# Altium footprint library 3.22-杂项.PcbLib: 985 footprints (part 42 of 64)
Each footprint in its own frame and in the unit in brackets; x right, y up, seen from the top. Pads: shape width x height; smd on the part's side, far side on the other; paste and mask are expansions set on the pad; w line width, h text height; cw(c..) or ccw(c..) is an arc to the next point about the centre after c.
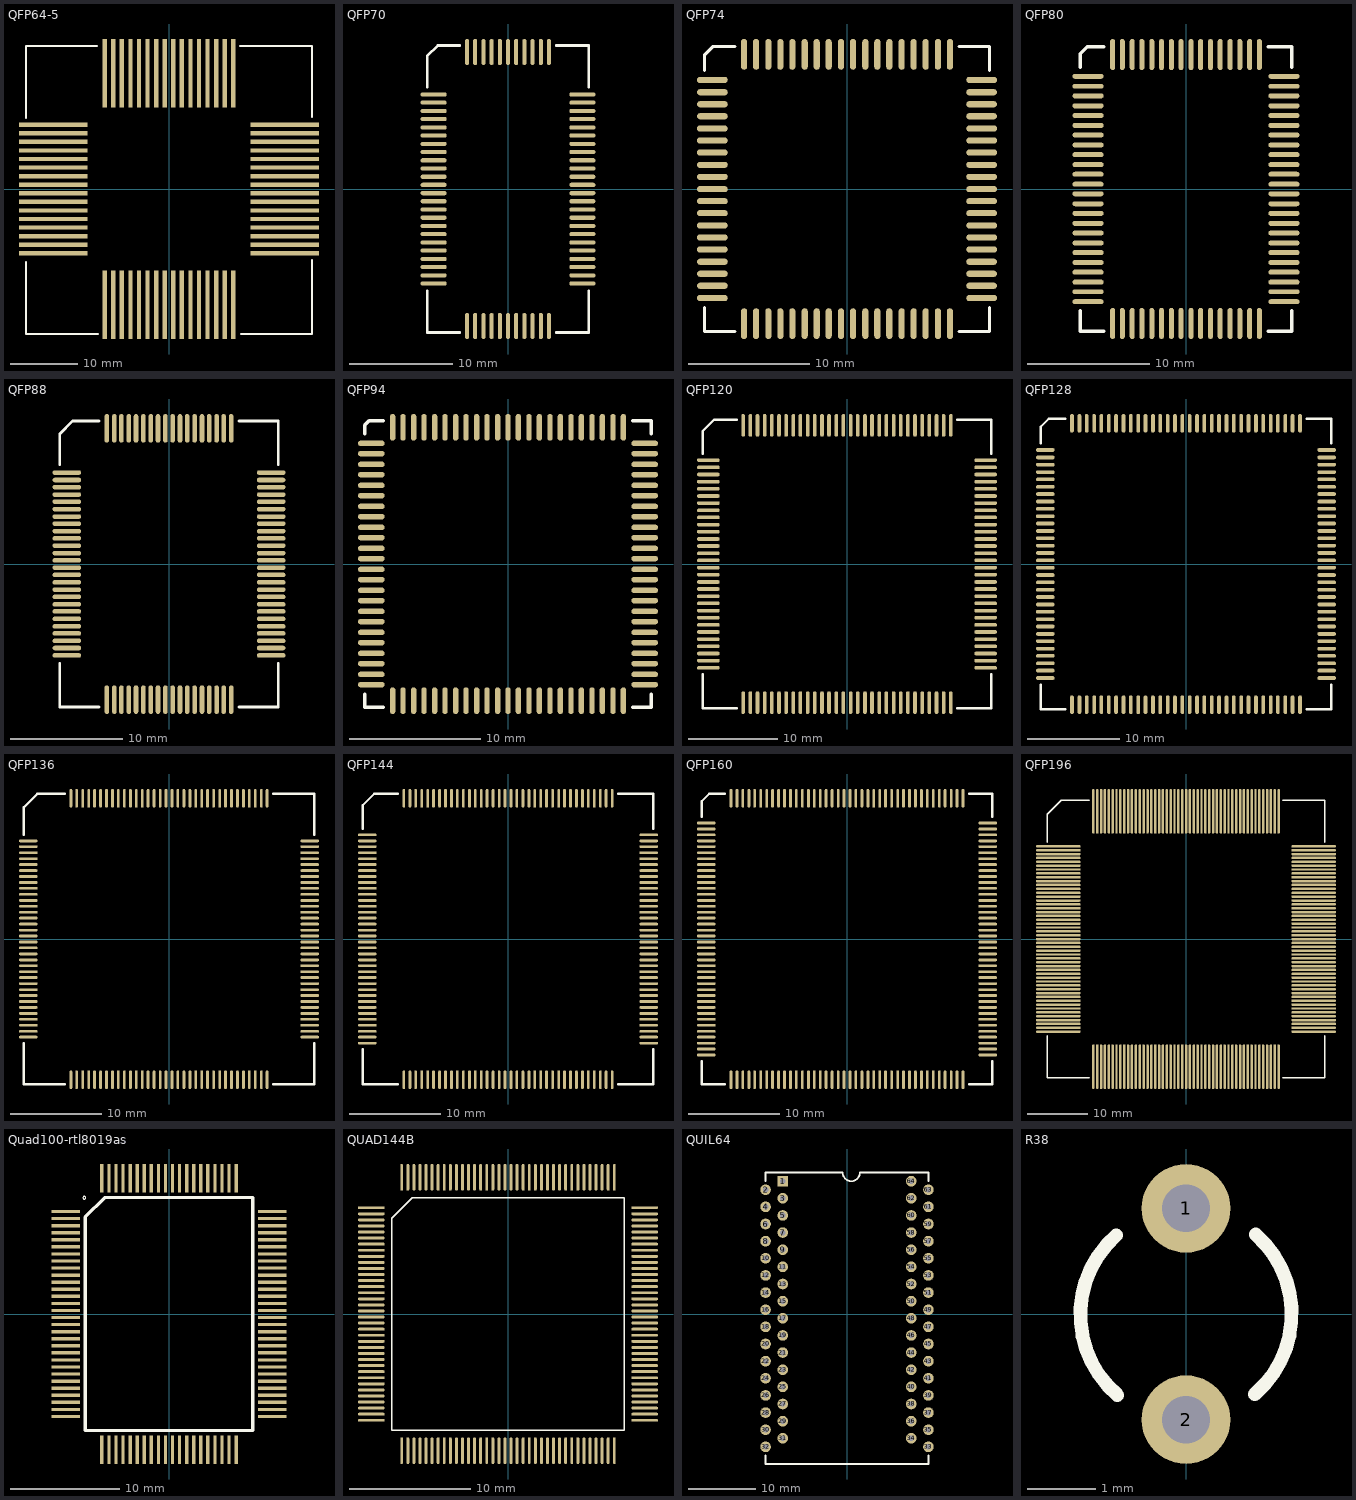
[diagram p41: the footprints below, top view; thin cyan lines are the x and y axes]

## QFP64-5 [mil]
pads (64):
  rect 400x25 smd: 1(-675,375) 2(-675,325) 3(-675,275) 4(-675,225) 5(-675,175) 6(-675,125) 7(-675,75) 8(-675,25) 9(-675,-25) 10(-675,-75) 11(-675,-125) 12(-675,-175) 13(-675,-225) 14(-675,-275) 15(-675,-325) 16(-675,-375) 33(675,-375) 34(675,-325) 35(675,-275) 36(675,-225) 37(675,-175) 38(675,-125) 39(675,-75) 40(675,-25) 41(675,25) 42(675,75) 43(675,125) 44(675,175) 45(675,225) 46(675,275) 47(675,325) 48(675,375)
  rect 25x400 smd: 17(-375,-675) 18(-325,-675) 19(-275,-675) 20(-225,-675) 21(-175,-675) 22(-125,-675) 23(-75,-675) 24(-25,-675) 25(25,-675) 26(75,-675) 27(125,-675) 28(175,-675) 29(225,-675) 30(275,-675) 31(325,-675) 32(375,-675) 49(375,675) 50(325,675) 51(275,675) 52(225,675) 53(175,675) 54(125,675) 55(75,675) 56(25,675) 57(-25,675) 58(-75,675) 59(-125,675) 60(-175,675) 61(-225,675) 62(-275,675) 63(-325,675) 64(-375,675)
Top Overlay:
  lines w12: -835,-425 -835,-845 -415,-845 ; -835,415 -835,835 -420,835 ; 415,835 835,835 835,420 ; 420,-845 835,-845 835,-415

## QFP70 [mil]
pads (70):
  oval 100x16 smd: 1(-285,362) 2(-285,331) 3(-285,299) 4(-285,268) 5(-285,236) 6(-285,205) 7(-285,173) 8(-285,142) 9(-285,110) 10(-285,79) 11(-285,47) 12(-285,16) 13(-285,-16) 14(-285,-47) 15(-285,-79) 16(-285,-110) 17(-285,-142) 18(-285,-173) 19(-285,-205) 20(-285,-236) 21(-285,-268) 22(-285,-299) 23(-285,-331) 24(-285,-362) 36(285,-362) 37(285,-331) 38(285,-299) 39(285,-268) 40(285,-236) 41(285,-205) 42(285,-173) 43(285,-142) 44(285,-110) 45(285,-79) 46(285,-47) 47(285,-16) 48(285,16) 49(285,47) 50(285,79) 51(285,110) 52(285,142) 53(285,173) 54(285,205) 55(285,236) 56(285,268) 57(285,299) 58(285,331) 59(285,362)
  oval 16x100 smd: 25(-157,-525) 26(-126,-525) 27(-94,-525) 28(-63,-525) 29(-31,-525) 30(0,-525) 31(31,-525) 32(63,-525) 33(94,-525) 34(126,-525) 35(157,-525) 60(157,525) 61(126,525) 62(94,525) 63(63,525) 64(31,525) 65(0,525) 66(-31,525) 67(-63,525) 68(-94,525) 69(-126,525) 70(-157,525)
Top Overlay:
  lines w10: -310,-390 -310,-550 -185,-550 ; -310,390 -310,509 -269,550 -185,550 ; 185,-550 310,-550 310,-390 ; 185,550 310,550 310,390

## QFP74 [mil]
pads (74):
  oval 100x20 smd: 1(-437.5,354.5) 2(-437.5,314.5) 3(-437.5,275.5) 4(-437.5,236.5) 5(-437.5,196.5) 6(-437.5,157.5) 7(-437.5,118.5) 8(-437.5,78.5) 9(-437.5,39.5) 10(-437.5,-0.5) 11(-437.5,-39.5) 12(-437.5,-78.5) 13(-437.5,-118.5) 14(-437.5,-157.5) 15(-437.5,-196.5) 16(-437.5,-236.5) 17(-437.5,-275.5) 18(-437.5,-314.5) 19(-437.5,-354.5) 38(437.5,-354.5) 39(437.5,-314.5) 40(437.5,-275.5) 41(437.5,-236.5) 42(437.5,-196.5) 43(437.5,-157.5) 44(437.5,-118.5) 45(437.5,-78.5) 46(437.5,-39.5) 47(437.5,-0.5) 48(437.5,39.5) 49(437.5,78.5) 50(437.5,118.5) 51(437.5,157.5) 52(437.5,196.5) 53(437.5,236.5) 54(437.5,275.5) 55(437.5,314.5) 56(437.5,354.5)
  oval 20x100 smd: 20(-334.5,-437.5) 21(-295.5,-437.5) 22(-255.5,-437.5) 23(-216.5,-437.5) 24(-177.5,-437.5) 25(-137.5,-437.5) 26(-98.5,-437.5) 27(-59.5,-437.5) 28(-19.5,-437.5) 29(19.5,-437.5) 30(59.5,-437.5) 31(98.5,-437.5) 32(137.5,-437.5) 33(177.5,-437.5) 34(216.5,-437.5) 35(255.5,-437.5) 36(295.5,-437.5) 37(334.5,-437.5) 57(334.5,437.5) 58(295.5,437.5) 59(255.5,437.5) 60(216.5,437.5) 61(177.5,437.5) 62(137.5,437.5) 63(98.5,437.5) 64(59.5,437.5) 65(19.5,437.5) 66(-19.5,437.5) 67(-59.5,437.5) 68(-98.5,437.5) 69(-137.5,437.5) 70(-177.5,437.5) 71(-216.5,437.5) 72(-255.5,437.5) 73(-295.5,437.5) 74(-334.5,437.5)
Top Overlay:
  lines w10: -462.5,-384.5 -462.5,-462.5 -364.5,-462.5 ; -462.5,384.5 -462.5,436.5 -436.5,462.5 -364.5,462.5 ; 364.5,-462.5 462.5,-462.5 462.5,-384.5 ; 364.5,462.5 462.5,462.5 462.5,384.5

## QFP80 [mil]
pads (80):
  oval 100x16 smd: 1(-315,362.5) 2(-315,330.5) 3(-315,299.5) 4(-315,267.5) 5(-315,236.5) 6(-315,204.5) 7(-315,173.5) 8(-315,141.5) 9(-315,110.5) 10(-315,78.5) 11(-315,47.5) 12(-315,15.5) 13(-315,-15.5) 14(-315,-47.5) 15(-315,-78.5) 16(-315,-110.5) 17(-315,-141.5) 18(-315,-173.5) 19(-315,-204.5) 20(-315,-236.5) 21(-315,-267.5) 22(-315,-299.5) 23(-315,-330.5) 24(-315,-362.5) 41(315,-362.5) 42(315,-330.5) 43(315,-299.5) 44(315,-267.5) 45(315,-236.5) 46(315,-204.5) 47(315,-173.5) 48(315,-141.5) 49(315,-110.5) 50(315,-78.5) 51(315,-47.5) 52(315,-15.5) 53(315,15.5) 54(315,47.5) 55(315,78.5) 56(315,110.5) 57(315,141.5) 58(315,173.5) 59(315,204.5) 60(315,236.5) 61(315,267.5) 62(315,299.5) 63(315,330.5) 64(315,362.5)
  oval 16x100 smd: 25(-236,-432.5) 26(-205,-432.5) 27(-173,-432.5) 28(-142,-432.5) 29(-110,-432.5) 30(-79,-432.5) 31(-47,-432.5) 32(-16,-432.5) 33(16,-432.5) 34(47,-432.5) 35(79,-432.5) 36(110,-432.5) 37(142,-432.5) 38(173,-432.5) 39(205,-432.5) 40(236,-432.5) 65(236,432.5) 66(205,432.5) 67(173,432.5) 68(142,432.5) 69(110,432.5) 70(79,432.5) 71(47,432.5) 72(16,432.5) 73(-16,432.5) 74(-47,432.5) 75(-79,432.5) 76(-110,432.5) 77(-142,432.5) 78(-173,432.5) 79(-205,432.5) 80(-236,432.5)
Top Overlay:
  lines w10: -340,-390.5 -340,-457.5 -264,-457.5 ; -340,390.5 -340,435.5 -318,457.5 -264,457.5 ; 264,-457.5 340,-457.5 340,-390.5 ; 264,457.5 340,457.5 340,390.5

## QFP88 [mil]
pads (88):
  oval 100x16 smd: 1(-357.5,320) 2(-357.5,294) 3(-357.5,269) 4(-357.5,243) 5(-357.5,218) 6(-357.5,192) 7(-357.5,166) 8(-357.5,141) 9(-357.5,115) 10(-357.5,90) 11(-357.5,64) 12(-357.5,38) 13(-357.5,13) 14(-357.5,-13) 15(-357.5,-38) 16(-357.5,-64) 17(-357.5,-90) 18(-357.5,-115) 19(-357.5,-141) 20(-357.5,-166) 21(-357.5,-192) 22(-357.5,-218) 23(-357.5,-243) 24(-357.5,-269) 25(-357.5,-294) 26(-357.5,-320) 45(357.5,-320) 46(357.5,-294) 47(357.5,-269) 48(357.5,-243) 49(357.5,-218) 50(357.5,-192) 51(357.5,-166) 52(357.5,-141) 53(357.5,-115) 54(357.5,-90) 55(357.5,-64) 56(357.5,-38) 57(357.5,-13) 58(357.5,13) 59(357.5,38) 60(357.5,64) 61(357.5,90) 62(357.5,115) 63(357.5,141) 64(357.5,166) 65(357.5,192) 66(357.5,218) 67(357.5,243) 68(357.5,269) 69(357.5,294) 70(357.5,320)
  oval 16x100 smd: 27(-217.5,-475) 28(-191.5,-475) 29(-166.5,-475) 30(-140.5,-475) 31(-115.5,-475) 32(-89.5,-475) 33(-63.5,-475) 34(-38.5,-475) 35(-12.5,-475) 36(12.5,-475) 37(38.5,-475) 38(63.5,-475) 39(89.5,-475) 40(115.5,-475) 41(140.5,-475) 42(166.5,-475) 43(191.5,-475) 44(217.5,-475) 71(217.5,475) 72(191.5,475) 73(166.5,475) 74(140.5,475) 75(115.5,475) 76(89.5,475) 77(63.5,475) 78(38.5,475) 79(12.5,475) 80(-12.5,475) 81(-38.5,475) 82(-63.5,475) 83(-89.5,475) 84(-115.5,475) 85(-140.5,475) 86(-166.5,475) 87(-191.5,475) 88(-217.5,475)
Top Overlay:
  lines w10: -382.5,-348 -382.5,-500 -245.5,-500 ; -382.5,348 -382.5,455 -337.5,500 -245.5,500 ; 245.5,-500 382.5,-500 382.5,-348 ; 245.5,500 382.5,500 382.5,348

## QFP94 [mil]
pads (94):
  oval 80x16 smd: 1(-410,362) 2(-410,331) 3(-410,299) 4(-410,268) 5(-410,236) 6(-410,205) 7(-410,173) 8(-410,142) 9(-410,110) 10(-410,79) 11(-410,47) 12(-410,16) 13(-410,-16) 14(-410,-47) 15(-410,-79) 16(-410,-110) 17(-410,-142) 18(-410,-173) 19(-410,-205) 20(-410,-236) 21(-410,-268) 22(-410,-299) 23(-410,-331) 24(-410,-362) 48(410,-362) 49(410,-331) 50(410,-299) 51(410,-268) 52(410,-236) 53(410,-205) 54(410,-173) 55(410,-142) 56(410,-110) 57(410,-79) 58(410,-47) 59(410,-16) 60(410,16) 61(410,47) 62(410,79) 63(410,110) 64(410,142) 65(410,173) 66(410,205) 67(410,236) 68(410,268) 69(410,299) 70(410,331) 71(410,362)
  oval 16x80 smd: 25(-346,-410) 26(-315,-410) 27(-283,-410) 28(-252,-410) 29(-220,-410) 30(-189,-410) 31(-157,-410) 32(-126,-410) 33(-94,-410) 34(-63,-410) 35(-31,-410) 36(0,-410) 37(31,-410) 38(63,-410) 39(94,-410) 40(126,-410) 41(157,-410) 42(189,-410) 43(220,-410) 44(252,-410) 45(283,-410) 46(315,-410) 47(346,-410) 72(346,410) 73(315,410) 74(283,410) 75(252,410) 76(220,410) 77(189,410) 78(157,410) 79(126,410) 80(94,410) 81(63,410) 82(31,410) 83(0,410) 84(-31,410) 85(-63,410) 86(-94,410) 87(-126,410) 88(-157,410) 89(-189,410) 90(-220,410) 91(-252,410) 92(-283,410) 93(-315,410) 94(-346,410)
Top Overlay:
  lines w10: -430,-390 -430,-430 -374,-430 ; -430,390 -430,417 -417,430 -374,430 ; 374,-430 430,-430 430,-390 ; 374,430 430,430 430,390

## QFP120 [mil]
pads (120):
  oval 100x16 smd: 1(-610,457) 2(-610,425) 3(-610,394) 4(-610,362) 5(-610,331) 6(-610,299) 7(-610,268) 8(-610,236) 9(-610,205) 10(-610,173) 11(-610,142) 12(-610,110) 13(-610,79) 14(-610,47) 15(-610,16) 16(-610,-16) 17(-610,-47) 18(-610,-79) 19(-610,-110) 20(-610,-142) 21(-610,-173) 22(-610,-205) 23(-610,-236) 24(-610,-268) 25(-610,-299) 26(-610,-331) 27(-610,-362) 28(-610,-394) 29(-610,-425) 30(-610,-457) 61(610,-457) 62(610,-425) 63(610,-394) 64(610,-362) 65(610,-331) 66(610,-299) 67(610,-268) 68(610,-236) 69(610,-205) 70(610,-173) 71(610,-142) 72(610,-110) 73(610,-79) 74(610,-47) 75(610,-16) 76(610,16) 77(610,47) 78(610,79) 79(610,110) 80(610,142) 81(610,173) 82(610,205) 83(610,236) 84(610,268) 85(610,299) 86(610,331) 87(610,362) 88(610,394) 89(610,425) 90(610,457)
  oval 16x100 smd: 31(-457,-610) 32(-425,-610) 33(-394,-610) 34(-362,-610) 35(-331,-610) 36(-299,-610) 37(-268,-610) 38(-236,-610) 39(-205,-610) 40(-173,-610) 41(-142,-610) 42(-110,-610) 43(-79,-610) 44(-47,-610) 45(-16,-610) 46(16,-610) 47(47,-610) 48(79,-610) 49(110,-610) 50(142,-610) 51(173,-610) 52(205,-610) 53(236,-610) 54(268,-610) 55(299,-610) 56(331,-610) 57(362,-610) 58(394,-610) 59(425,-610) 60(457,-610) 91(457,610) 92(425,610) 93(394,610) 94(362,610) 95(331,610) 96(299,610) 97(268,610) 98(236,610) 99(205,610) 100(173,610) 101(142,610) 102(110,610) 103(79,610) 104(47,610) 105(16,610) 106(-16,610) 107(-47,610) 108(-79,610) 109(-110,610) 110(-142,610) 111(-173,610) 112(-205,610) 113(-236,610) 114(-268,610) 115(-299,610) 116(-331,610) 117(-362,610) 118(-394,610) 119(-425,610) 120(-457,610)
Top Overlay:
  lines w10: -635,-485 -635,-635 -485,-635 ; -635,485 -635,585 -585,635 -485,635 ; 485,-635 635,-635 635,-485 ; 485,635 635,635 635,485

## QFP128 [mil]
pads (128):
  oval 80x16 smd: 1(-602.5,488.5) 2(-602.5,456.5) 3(-602.5,425.5) 4(-602.5,393.5) 5(-602.5,362.5) 6(-602.5,330.5) 7(-602.5,299.5) 8(-602.5,267.5) 9(-602.5,236.5) 10(-602.5,204.5) 11(-602.5,173.5) 12(-602.5,141.5) 13(-602.5,110.5) 14(-602.5,78.5) 15(-602.5,47.5) 16(-602.5,15.5) 17(-602.5,-15.5) 18(-602.5,-47.5) 19(-602.5,-78.5) 20(-602.5,-110.5) 21(-602.5,-141.5) 22(-602.5,-173.5) 23(-602.5,-204.5) 24(-602.5,-236.5) 25(-602.5,-267.5) 26(-602.5,-299.5) 27(-602.5,-330.5) 28(-602.5,-362.5) 29(-602.5,-393.5) 30(-602.5,-425.5) 31(-602.5,-456.5) 32(-602.5,-488.5) 65(602.5,-488.5) 66(602.5,-456.5) 67(602.5,-425.5) 68(602.5,-393.5) 69(602.5,-362.5) 70(602.5,-330.5) 71(602.5,-299.5) 72(602.5,-267.5) 73(602.5,-236.5) 74(602.5,-204.5) 75(602.5,-173.5) 76(602.5,-141.5) 77(602.5,-110.5) 78(602.5,-78.5) 79(602.5,-47.5) 80(602.5,-15.5) 81(602.5,15.5) 82(602.5,47.5) 83(602.5,78.5) 84(602.5,110.5) 85(602.5,141.5) 86(602.5,173.5) 87(602.5,204.5) 88(602.5,236.5) 89(602.5,267.5) 90(602.5,299.5) 91(602.5,330.5) 92(602.5,362.5) 93(602.5,393.5) 94(602.5,425.5) 95(602.5,456.5) 96(602.5,488.5)
  oval 16x80 smd: 33(-488.5,-602.5) 34(-456.5,-602.5) 35(-425.5,-602.5) 36(-393.5,-602.5) 37(-362.5,-602.5) 38(-330.5,-602.5) 39(-299.5,-602.5) 40(-267.5,-602.5) 41(-236.5,-602.5) 42(-204.5,-602.5) 43(-173.5,-602.5) 44(-141.5,-602.5) 45(-110.5,-602.5) 46(-78.5,-602.5) 47(-47.5,-602.5) 48(-15.5,-602.5) 49(15.5,-602.5) 50(47.5,-602.5) 51(78.5,-602.5) 52(110.5,-602.5) 53(141.5,-602.5) 54(173.5,-602.5) 55(204.5,-602.5) 56(236.5,-602.5) 57(267.5,-602.5) 58(299.5,-602.5) 59(330.5,-602.5) 60(362.5,-602.5) 61(393.5,-602.5) 62(425.5,-602.5) 63(456.5,-602.5) 64(488.5,-602.5) 97(488.5,602.5) 98(456.5,602.5) 99(425.5,602.5) 100(393.5,602.5) 101(362.5,602.5) 102(330.5,602.5) 103(299.5,602.5) 104(267.5,602.5) 105(236.5,602.5) 106(204.5,602.5) 107(173.5,602.5) 108(141.5,602.5) 109(110.5,602.5) 110(78.5,602.5) 111(47.5,602.5) 112(15.5,602.5) 113(-15.5,602.5) 114(-47.5,602.5) 115(-78.5,602.5) 116(-110.5,602.5) 117(-141.5,602.5) 118(-173.5,602.5) 119(-204.5,602.5) 120(-236.5,602.5) 121(-267.5,602.5) 122(-299.5,602.5) 123(-330.5,602.5) 124(-362.5,602.5) 125(-393.5,602.5) 126(-425.5,602.5) 127(-456.5,602.5) 128(-488.5,602.5)
Top Overlay:
  lines w10: -622.5,-516.5 -622.5,-622.5 -516.5,-622.5 ; -622.5,516.5 -622.5,587.5 -587.5,622.5 -516.5,622.5 ; 516.5,-622.5 622.5,-622.5 622.5,-516.5 ; 516.5,622.5 622.5,622.5 622.5,516.5

## QFP136 [mil]
pads (136):
  oval 80x12 smd: 1(-605,422) 2(-605,397) 3(-605,371) 4(-605,345) 5(-605,320) 6(-605,294) 7(-605,269) 8(-605,243) 9(-605,218) 10(-605,192) 11(-605,166) 12(-605,141) 13(-605,115) 14(-605,90) 15(-605,64) 16(-605,38) 17(-605,13) 18(-605,-13) 19(-605,-38) 20(-605,-64) 21(-605,-90) 22(-605,-115) 23(-605,-141) 24(-605,-166) 25(-605,-192) 26(-605,-218) 27(-605,-243) 28(-605,-269) 29(-605,-294) 30(-605,-320) 31(-605,-345) 32(-605,-371) 33(-605,-397) 34(-605,-422) 69(605,-422) 70(605,-397) 71(605,-371) 72(605,-345) 73(605,-320) 74(605,-294) 75(605,-269) 76(605,-243) 77(605,-218) 78(605,-192) 79(605,-166) 80(605,-141) 81(605,-115) 82(605,-90) 83(605,-64) 84(605,-38) 85(605,-13) 86(605,13) 87(605,38) 88(605,64) 89(605,90) 90(605,115) 91(605,141) 92(605,166) 93(605,192) 94(605,218) 95(605,243) 96(605,269) 97(605,294) 98(605,320) 99(605,345) 100(605,371) 101(605,397) 102(605,422)
  oval 12x80 smd: 35(-422,-605) 36(-397,-605) 37(-371,-605) 38(-345,-605) 39(-320,-605) 40(-294,-605) 41(-269,-605) 42(-243,-605) 43(-218,-605) 44(-192,-605) 45(-166,-605) 46(-141,-605) 47(-115,-605) 48(-90,-605) 49(-64,-605) 50(-38,-605) 51(-13,-605) 52(13,-605) 53(38,-605) 54(64,-605) 55(90,-605) 56(115,-605) 57(141,-605) 58(166,-605) 59(192,-605) 60(218,-605) 61(243,-605) 62(269,-605) 63(294,-605) 64(320,-605) 65(345,-605) 66(371,-605) 67(397,-605) 68(422,-605) 103(422,605) 104(397,605) 105(371,605) 106(345,605) 107(320,605) 108(294,605) 109(269,605) 110(243,605) 111(218,605) 112(192,605) 113(166,605) 114(141,605) 115(115,605) 116(90,605) 117(64,605) 118(38,605) 119(13,605) 120(-13,605) 121(-38,605) 122(-64,605) 123(-90,605) 124(-115,605) 125(-141,605) 126(-166,605) 127(-192,605) 128(-218,605) 129(-243,605) 130(-269,605) 131(-294,605) 132(-320,605) 133(-345,605) 134(-371,605) 135(-397,605) 136(-422,605)
Top Overlay:
  lines w10: -625,-448 -625,-625 -448,-625 ; -625,448 -625,566 -566,625 -448,625 ; 448,-625 625,-625 625,-448 ; 448,625 625,625 625,448

## QFP144 [mil]
pads (144):
  oval 80x12 smd: 1(-605,448) 2(-605,422) 3(-605,397) 4(-605,371) 5(-605,345) 6(-605,320) 7(-605,294) 8(-605,269) 9(-605,243) 10(-605,218) 11(-605,192) 12(-605,166) 13(-605,141) 14(-605,115) 15(-605,90) 16(-605,64) 17(-605,38) 18(-605,13) 19(-605,-13) 20(-605,-38) 21(-605,-64) 22(-605,-90) 23(-605,-115) 24(-605,-141) 25(-605,-166) 26(-605,-192) 27(-605,-218) 28(-605,-243) 29(-605,-269) 30(-605,-294) 31(-605,-320) 32(-605,-345) 33(-605,-371) 34(-605,-397) 35(-605,-422) 36(-605,-448) 73(605,-448) 74(605,-422) 75(605,-397) 76(605,-371) 77(605,-345) 78(605,-320) 79(605,-294) 80(605,-269) 81(605,-243) 82(605,-218) 83(605,-192) 84(605,-166) 85(605,-141) 86(605,-115) 87(605,-90) 88(605,-64) 89(605,-38) 90(605,-13) 91(605,13) 92(605,38) 93(605,64) 94(605,90) 95(605,115) 96(605,141) 97(605,166) 98(605,192) 99(605,218) 100(605,243) 101(605,269) 102(605,294) 103(605,320) 104(605,345) 105(605,371) 106(605,397) 107(605,422) 108(605,448)
  oval 12x80 smd: 37(-448,-605) 38(-422,-605) 39(-397,-605) 40(-371,-605) 41(-345,-605) 42(-320,-605) 43(-294,-605) 44(-269,-605) 45(-243,-605) 46(-218,-605) 47(-192,-605) 48(-166,-605) 49(-141,-605) 50(-115,-605) 51(-90,-605) 52(-64,-605) 53(-38,-605) 54(-13,-605) 55(13,-605) 56(38,-605) 57(64,-605) 58(90,-605) 59(115,-605) 60(141,-605) 61(166,-605) 62(192,-605) 63(218,-605) 64(243,-605) 65(269,-605) 66(294,-605) 67(320,-605) 68(345,-605) 69(371,-605) 70(397,-605) 71(422,-605) 72(448,-605) 109(448,605) 110(422,605) 111(397,605) 112(371,605) 113(345,605) 114(320,605) 115(294,605) 116(269,605) 117(243,605) 118(218,605) 119(192,605) 120(166,605) 121(141,605) 122(115,605) 123(90,605) 124(64,605) 125(38,605) 126(13,605) 127(-13,605) 128(-38,605) 129(-64,605) 130(-90,605) 131(-115,605) 132(-141,605) 133(-166,605) 134(-192,605) 135(-218,605) 136(-243,605) 137(-269,605) 138(-294,605) 139(-320,605) 140(-345,605) 141(-371,605) 142(-397,605) 143(-422,605) 144(-448,605)
Top Overlay:
  lines w10: -625,-474 -625,-625 -474,-625 ; -625,474 -625,575 -575,625 -474,625 ; 474,-625 625,-625 625,-474 ; 474,625 625,625 625,474

## QFP160 [mil]
pads (160):
  oval 80x12 smd: 1(-605,499) 2(-605,473) 3(-605,448) 4(-605,422) 5(-605,397) 6(-605,371) 7(-605,345) 8(-605,320) 9(-605,294) 10(-605,269) 11(-605,243) 12(-605,218) 13(-605,192) 14(-605,166) 15(-605,141) 16(-605,115) 17(-605,90) 18(-605,64) 19(-605,38) 20(-605,13) 21(-605,-13) 22(-605,-38) 23(-605,-64) 24(-605,-90) 25(-605,-115) 26(-605,-141) 27(-605,-166) 28(-605,-192) 29(-605,-218) 30(-605,-243) 31(-605,-269) 32(-605,-294) 33(-605,-320) 34(-605,-345) 35(-605,-371) 36(-605,-397) 37(-605,-422) 38(-605,-448) 39(-605,-473) 40(-605,-499) 81(605,-499) 82(605,-473) 83(605,-448) 84(605,-422) 85(605,-397) 86(605,-371) 87(605,-345) 88(605,-320) 89(605,-294) 90(605,-269) 91(605,-243) 92(605,-218) 93(605,-192) 94(605,-166) 95(605,-141) 96(605,-115) 97(605,-90) 98(605,-64) 99(605,-38) 100(605,-13) 101(605,13) 102(605,38) 103(605,64) 104(605,90) 105(605,115) 106(605,141) 107(605,166) 108(605,192) 109(605,218) 110(605,243) 111(605,269) 112(605,294) 113(605,320) 114(605,345) 115(605,371) 116(605,397) 117(605,422) 118(605,448) 119(605,473) 120(605,499)
  oval 12x80 smd: 41(-499,-605) 42(-473,-605) 43(-448,-605) 44(-422,-605) 45(-397,-605) 46(-371,-605) 47(-345,-605) 48(-320,-605) 49(-294,-605) 50(-269,-605) 51(-243,-605) 52(-218,-605) 53(-192,-605) 54(-166,-605) 55(-141,-605) 56(-115,-605) 57(-90,-605) 58(-64,-605) 59(-38,-605) 60(-13,-605) 61(13,-605) 62(38,-605) 63(64,-605) 64(90,-605) 65(115,-605) 66(141,-605) 67(166,-605) 68(192,-605) 69(218,-605) 70(243,-605) 71(269,-605) 72(294,-605) 73(320,-605) 74(345,-605) 75(371,-605) 76(397,-605) 77(422,-605) 78(448,-605) 79(473,-605) 80(499,-605) 121(499,605) 122(473,605) 123(448,605) 124(422,605) 125(397,605) 126(371,605) 127(345,605) 128(320,605) 129(294,605) 130(269,605) 131(243,605) 132(218,605) 133(192,605) 134(166,605) 135(141,605) 136(115,605) 137(90,605) 138(64,605) 139(38,605) 140(13,605) 141(-13,605) 142(-38,605) 143(-64,605) 144(-90,605) 145(-115,605) 146(-141,605) 147(-166,605) 148(-192,605) 149(-218,605) 150(-243,605) 151(-269,605) 152(-294,605) 153(-320,605) 154(-345,605) 155(-371,605) 156(-397,605) 157(-422,605) 158(-448,605) 159(-473,605) 160(-499,605)
Top Overlay:
  lines w10: -625,-525 -625,-625 -525,-625 ; -625,525 -625,592 -592,625 -525,625 ; 525,-625 625,-625 625,-525 ; 525,625 625,625 625,525

## QFP196 [mil]
pads (196):
  oval 290x16 smd: 1(-827.5,600.5) 2(-827.5,575.5) 3(-827.5,550.5) 4(-827.5,525.5) 5(-827.5,500.5) 6(-827.5,475.5) 7(-827.5,450.5) 8(-827.5,425.5) 9(-827.5,400.5) 10(-827.5,375.5) 11(-827.5,350.5) 12(-827.5,325.5) 13(-827.5,299.5) 14(-827.5,274.5) 15(-827.5,249.5) 16(-827.5,224.5) 17(-827.5,199.5) 18(-827.5,174.5) 19(-827.5,149.5) 20(-827.5,124.5) 21(-827.5,99.5) 22(-827.5,74.5) 23(-827.5,49.5) 24(-827.5,24.5) 25(-827.5,-0.5) 26(-827.5,-25.5) 27(-827.5,-50.5) 28(-827.5,-75.5) 29(-827.5,-100.5) 30(-827.5,-125.5) 31(-827.5,-150.5) 32(-827.5,-175.5) 33(-827.5,-200.5) 34(-827.5,-225.5) 35(-827.5,-250.5) 36(-827.5,-275.5) 37(-827.5,-300.5) 38(-827.5,-325.5) 39(-827.5,-350.5) 40(-827.5,-375.5) 41(-827.5,-400.5) 42(-827.5,-425.5) 43(-827.5,-450.5) 44(-827.5,-475.5) 45(-827.5,-500.5) 46(-827.5,-525.5) 47(-827.5,-550.5) 48(-827.5,-575.5) 49(-827.5,-600.5) 99(827.5,-600.5) 100(827.5,-575.5) 101(827.5,-550.5) 102(827.5,-525.5) 103(827.5,-500.5) 104(827.5,-475.5) 105(827.5,-450.5) 106(827.5,-425.5) 107(827.5,-400.5) 108(827.5,-375.5) 109(827.5,-350.5) 110(827.5,-325.5) 111(827.5,-300.5) 112(827.5,-275.5) 113(827.5,-250.5) 114(827.5,-225.5) 115(827.5,-200.5) 116(827.5,-175.5) 117(827.5,-150.5) 118(827.5,-125.5) 119(827.5,-100.5) 120(827.5,-75.5) 121(827.5,-50.5) 122(827.5,-25.5) 123(827.5,-0.5) 124(827.5,24.5) 125(827.5,49.5) 126(827.5,74.5) 127(827.5,99.5) 128(827.5,124.5) 129(827.5,149.5) 130(827.5,174.5) 131(827.5,199.5) 132(827.5,224.5) 133(827.5,249.5) 134(827.5,274.5) 135(827.5,299.5) 136(827.5,325.5) 137(827.5,350.5) 138(827.5,375.5) 139(827.5,400.5) 140(827.5,425.5) 141(827.5,450.5) 142(827.5,475.5) 143(827.5,500.5) 144(827.5,525.5) 145(827.5,550.5) 146(827.5,575.5) 147(827.5,600.5)
  oval 16x290 smd: 50(-600.5,-827.5) 51(-575.5,-827.5) 52(-550.5,-827.5) 53(-525.5,-827.5) 54(-500.5,-827.5) 55(-475.5,-827.5) 56(-450.5,-827.5) 57(-425.5,-827.5) 58(-400.5,-827.5) 59(-375.5,-827.5) 60(-350.5,-827.5) 61(-325.5,-827.5) 62(-299.5,-827.5) 63(-274.5,-827.5) 64(-249.5,-827.5) 65(-224.5,-827.5) 66(-199.5,-827.5) 67(-174.5,-827.5) 68(-149.5,-827.5) 69(-124.5,-827.5) 70(-99.5,-827.5) 71(-74.5,-827.5) 72(-49.5,-827.5) 73(-24.5,-827.5) 74(0.5,-827.5) 75(25.5,-827.5) 76(50.5,-827.5) 77(75.5,-827.5) 78(100.5,-827.5) 79(125.5,-827.5) 80(150.5,-827.5) 81(175.5,-827.5) 82(200.5,-827.5) 83(225.5,-827.5) 84(250.5,-827.5) 85(275.5,-827.5) 86(300.5,-827.5) 87(325.5,-827.5) 88(350.5,-827.5) 89(375.5,-827.5) 90(400.5,-827.5) 91(425.5,-827.5) 92(450.5,-827.5) 93(475.5,-827.5) 94(500.5,-827.5) 95(525.5,-827.5) 96(550.5,-827.5) 97(575.5,-827.5) 98(600.5,-827.5) 148(600.5,827.5) 149(575.5,827.5) 150(550.5,827.5) 151(525.5,827.5) 152(500.5,827.5) 153(475.5,827.5) 154(450.5,827.5) 155(425.5,827.5) 156(400.5,827.5) 157(375.5,827.5) 158(350.5,827.5) 159(325.5,827.5) 160(300.5,827.5) 161(275.5,827.5) 162(250.5,827.5) 163(225.5,827.5) 164(200.5,827.5) 165(175.5,827.5) 166(150.5,827.5) 167(125.5,827.5) 168(100.5,827.5) 169(75.5,827.5) 170(50.5,827.5) 171(25.5,827.5) 172(0.5,827.5) 173(-24.5,827.5) 174(-49.5,827.5) 175(-74.5,827.5) 176(-99.5,827.5) 177(-124.5,827.5) 178(-149.5,827.5) 179(-174.5,827.5) 180(-199.5,827.5) 181(-224.5,827.5) 182(-249.5,827.5) 183(-274.5,827.5) 184(-299.5,827.5) 185(-325.5,827.5) 186(-350.5,827.5) 187(-375.5,827.5) 188(-400.5,827.5) 189(-425.5,827.5) 190(-450.5,827.5) 191(-475.5,827.5) 192(-500.5,827.5) 193(-525.5,827.5) 194(-550.5,827.5) 195(-575.5,827.5) 196(-600.5,827.5)
Top Overlay:
  lines w10: -899.5,-627.5 -899.5,-899.5 -627.5,-899.5 ; -899.5,627.5 -899.5,809.5 -809.5,899.5 -627.5,899.5 ; 627.5,-899.5 899.5,-899.5 899.5,-627.5 ; 627.5,899.5 899.5,899.5 899.5,627.5

## Quad100-rtl8019as [mm] "100脚QFP,0.3宽,0.65间距,rtl8019as"
pads (100):
  rect 2.6x0.3 smd: 1(-9.5,9.425) 2(-9.5,8.775) 3(-9.5,8.125) 4(-9.5,7.475) 5(-9.5,6.825) 6(-9.5,6.175) 7(-9.5,5.525) 8(-9.5,4.875) 9(-9.5,4.225) 10(-9.5,3.575) 11(-9.5,2.925) 12(-9.5,2.275) 13(-9.5,1.625) 14(-9.5,0.975) 15(-9.5,0.325) 16(-9.5,-0.325) 17(-9.5,-0.975) 18(-9.5,-1.625) 19(-9.5,-2.275) 20(-9.5,-2.925) 21(-9.5,-3.575) 22(-9.5,-4.225) 23(-9.5,-4.875) 24(-9.5,-5.525) 25(-9.5,-6.175) 26(-9.5,-6.825) 27(-9.5,-7.475) 28(-9.5,-8.125) 29(-9.5,-8.775) 30(-9.5,-9.425) 51(9.5,-9.425) 52(9.5,-8.775) 53(9.5,-8.125) 54(9.5,-7.475) 55(9.5,-6.825) 56(9.5,-6.175) 57(9.5,-5.525) 58(9.5,-4.875) 59(9.5,-4.225) 60(9.5,-3.575) 61(9.5,-2.925) 62(9.5,-2.275) 63(9.5,-1.625) 64(9.5,-0.975) 65(9.5,-0.325) 66(9.5,0.325) 67(9.5,0.975) 68(9.5,1.625) 69(9.5,2.275) 70(9.5,2.925) 71(9.5,3.575) 72(9.5,4.225) 73(9.5,4.875) 74(9.5,5.525) 75(9.5,6.175) 76(9.5,6.825) 77(9.5,7.475) 78(9.5,8.125) 79(9.5,8.775) 80(9.5,9.425)
  rect 0.3x2.6 smd: 31(-6.175,-12.5) 32(-5.525,-12.5) 33(-4.875,-12.5) 34(-4.225,-12.5) 35(-3.575,-12.5) 36(-2.925,-12.5) 37(-2.275,-12.5) 38(-1.625,-12.5) 39(-0.975,-12.5) 40(-0.325,-12.5) 41(0.325,-12.5) 42(0.975,-12.5) 43(1.625,-12.5) 44(2.275,-12.5) 45(2.925,-12.5) 46(3.575,-12.5) 47(4.225,-12.5) 48(4.875,-12.5) 49(5.525,-12.5) 50(6.175,-12.5) 81(6.175,12.5) 82(5.525,12.5) 83(4.875,12.5) 84(4.225,12.5) 85(3.575,12.5) 86(2.925,12.5) 87(2.275,12.5) 88(1.625,12.5) 89(0.975,12.5) 90(0.325,12.5) 91(-0.325,12.5) 92(-0.975,12.5) 93(-1.625,12.5) 94(-2.275,12.5) 95(-2.925,12.5) 96(-3.575,12.5) 97(-4.225,12.5) 98(-4.875,12.5) 99(-5.525,12.5) 100(-6.175,12.5)
Top Overlay:
  circle w0.025: c-7.786,10.695 r0.127
  lines w0.3: -7.715,-10.715 -7.715,8.93 -5.93,10.715 7.715,10.715 7.715,-10.715 -7.715,-10.715

## QUAD144B [mm]
pads (144):
  rect 2.2x0.24 smd: 1(-11.25,8.75)
  oval 2.2x0.24 smd: 2(-11.25,8.25) 3(-11.25,7.75) 4(-11.25,7.25) 5(-11.25,6.75) 6(-11.25,6.25) 7(-11.25,5.75) 8(-11.25,5.25) 9(-11.25,4.75) 10(-11.25,4.25) 11(-11.25,3.75) 12(-11.25,3.25) 13(-11.25,2.75) 14(-11.25,2.25) 15(-11.25,1.75) 16(-11.25,1.25) 17(-11.25,0.75) 18(-11.25,0.25) 19(-11.25,-0.25) 20(-11.25,-0.75) 21(-11.25,-1.25) 22(-11.25,-1.75) 23(-11.25,-2.25) 24(-11.25,-2.75) 25(-11.25,-3.25) 26(-11.25,-3.75) 27(-11.25,-4.25) 28(-11.25,-4.75) 29(-11.25,-5.25) 30(-11.25,-5.75) 31(-11.25,-6.25) 32(-11.25,-6.75) 33(-11.25,-7.25) 34(-11.25,-7.75) 35(-11.25,-8.25) 36(-11.25,-8.75) 73(11.25,-8.75) 74(11.25,-8.25) 75(11.25,-7.75) 76(11.25,-7.25) 77(11.25,-6.75) 78(11.25,-6.25) 79(11.25,-5.75) 80(11.25,-5.25) 81(11.25,-4.75) 82(11.25,-4.25) 83(11.25,-3.75) 84(11.25,-3.25) 85(11.25,-2.75) 86(11.25,-2.25) 87(11.25,-1.75) 88(11.25,-1.25) 89(11.25,-0.75) 90(11.25,-0.25) 91(11.25,0.25) 92(11.25,0.75) 93(11.25,1.25) 94(11.25,1.75) 95(11.25,2.25) 96(11.25,2.75) 97(11.25,3.25) 98(11.25,3.75) 99(11.25,4.25) 100(11.25,4.75) 101(11.25,5.25) 102(11.25,5.75) 103(11.25,6.25) 104(11.25,6.75) 105(11.25,7.25) 106(11.25,7.75) 107(11.25,8.25) 108(11.25,8.75)
  oval 0.24x2.2 smd: 37(-8.75,-11.25) 38(-8.25,-11.25) 39(-7.75,-11.25) 40(-7.25,-11.25) 41(-6.75,-11.25) 42(-6.25,-11.25) 43(-5.75,-11.25) 44(-5.25,-11.25) 45(-4.75,-11.25) 46(-4.25,-11.25) 47(-3.75,-11.25) 48(-3.25,-11.25) 49(-2.75,-11.25) 50(-2.25,-11.25) 51(-1.75,-11.25) 52(-1.25,-11.25) 53(-0.75,-11.25) 54(-0.25,-11.25) 55(0.25,-11.25) 56(0.75,-11.25) 57(1.25,-11.25) 58(1.75,-11.25) 59(2.25,-11.25) 60(2.75,-11.25) 61(3.25,-11.25) 62(3.75,-11.25) 63(4.25,-11.25) 64(4.75,-11.25) 65(5.25,-11.25) 66(5.75,-11.25) 67(6.25,-11.25) 68(6.75,-11.25) 69(7.25,-11.25) 70(7.75,-11.25) 71(8.25,-11.25) 72(8.75,-11.25) 109(8.75,11.25) 110(8.25,11.25) 111(7.75,11.25) 112(7.25,11.25) 113(6.75,11.25) 114(6.25,11.25) 115(5.75,11.25) 116(5.25,11.25) 117(4.75,11.25) 118(4.25,11.25) 119(3.75,11.25) 120(3.25,11.25) 121(2.75,11.25) 122(2.25,11.25) 123(1.75,11.25) 124(1.25,11.25) 125(0.75,11.25) 126(0.25,11.25) 127(-0.25,11.25) 128(-0.75,11.25) 129(-1.25,11.25) 130(-1.75,11.25) 131(-2.25,11.25) 132(-2.75,11.25) 133(-3.25,11.25) 134(-3.75,11.25) 135(-4.25,11.25) 136(-4.75,11.25) 137(-5.25,11.25) 138(-5.75,11.25) 139(-6.25,11.25) 140(-6.75,11.25) 141(-7.25,11.25) 142(-7.75,11.25) 143(-8.25,11.25) 144(-8.75,11.25)
Top Overlay:
  lines w0.12: -9.575,-9.575 -9.575,7.9 -7.9,9.575 9.575,9.575 9.575,-9.575 -9.575,-9.575

## QUIL64 [mil]
pads (64):
  rect 62x62 hole 32: 1(-375,775)
  round 62 hole 32: 2(-475,725) 3(-375,675) 4(-475,625) 5(-375,575) 6(-475,525) 7(-375,475) 8(-475,425) 9(-375,375) 10(-475,325) 11(-375,275) 12(-475,225) 13(-375,175) 14(-475,125) 15(-375,75) 16(-475,25) 17(-375,-25) 18(-475,-75) 19(-375,-125) 20(-475,-175) 21(-375,-225) 22(-475,-275) 23(-375,-325) 24(-475,-375) 25(-375,-425) 26(-475,-475) 27(-375,-525) 28(-475,-575) 29(-375,-625) 30(-475,-675) 31(-375,-725) 32(-475,-775) 33(475,-775) 34(375,-725) 35(475,-675) 36(375,-625) 37(475,-575) 38(375,-525) 39(475,-475) 40(375,-425) 41(475,-375) 42(375,-325) 43(475,-275) 44(375,-225) 45(475,-175) 46(375,-125) 47(475,-75) 48(375,-25) 49(475,25) 50(375,75) 51(475,125) 52(375,175) 53(475,225) 54(375,275) 55(475,325) 56(375,375) 57(475,425) 58(375,475) 59(475,525) 60(375,575) 61(475,625) 62(375,675) 63(475,725) 64(375,775)
Top Overlay:
  lines w10: -25,825 ccw(c25,825) 75,825
  lines w12: -475,-825 -475,-875 475,-875 475,-825 ; -475,775 -475,825 -25,825 ; 75,825 475,825 475,775

## R38 [mm] "Crystal, Thru-Hole; 2 Leads; Body 3.1 x 8.2 mm (Dia.xH)"
height 8.2
pads (2):
  round 1.3 hole 0.7: 1(0,1.55) 2(0,-1.55)
Top Overlay:
  lines w0.2: -1.022,1.155 ccw(c0,-0.01) -1.006,-1.189 ; 1.006,-1.179 ccw(c0,0) 1.022,1.165